# Altium footprint library PCB_Footprints.PcbLib: 303 footprints (part 18 of 19)
Each footprint in its own frame and in the unit in brackets; x right, y up, seen from the top. Pads: shape width x height; smd on the part's side, far side on the other; paste and mask are expansions set on the pad; w line width, h text height; cw(c..) or ccw(c..) is an arc to the next point about the centre after c.
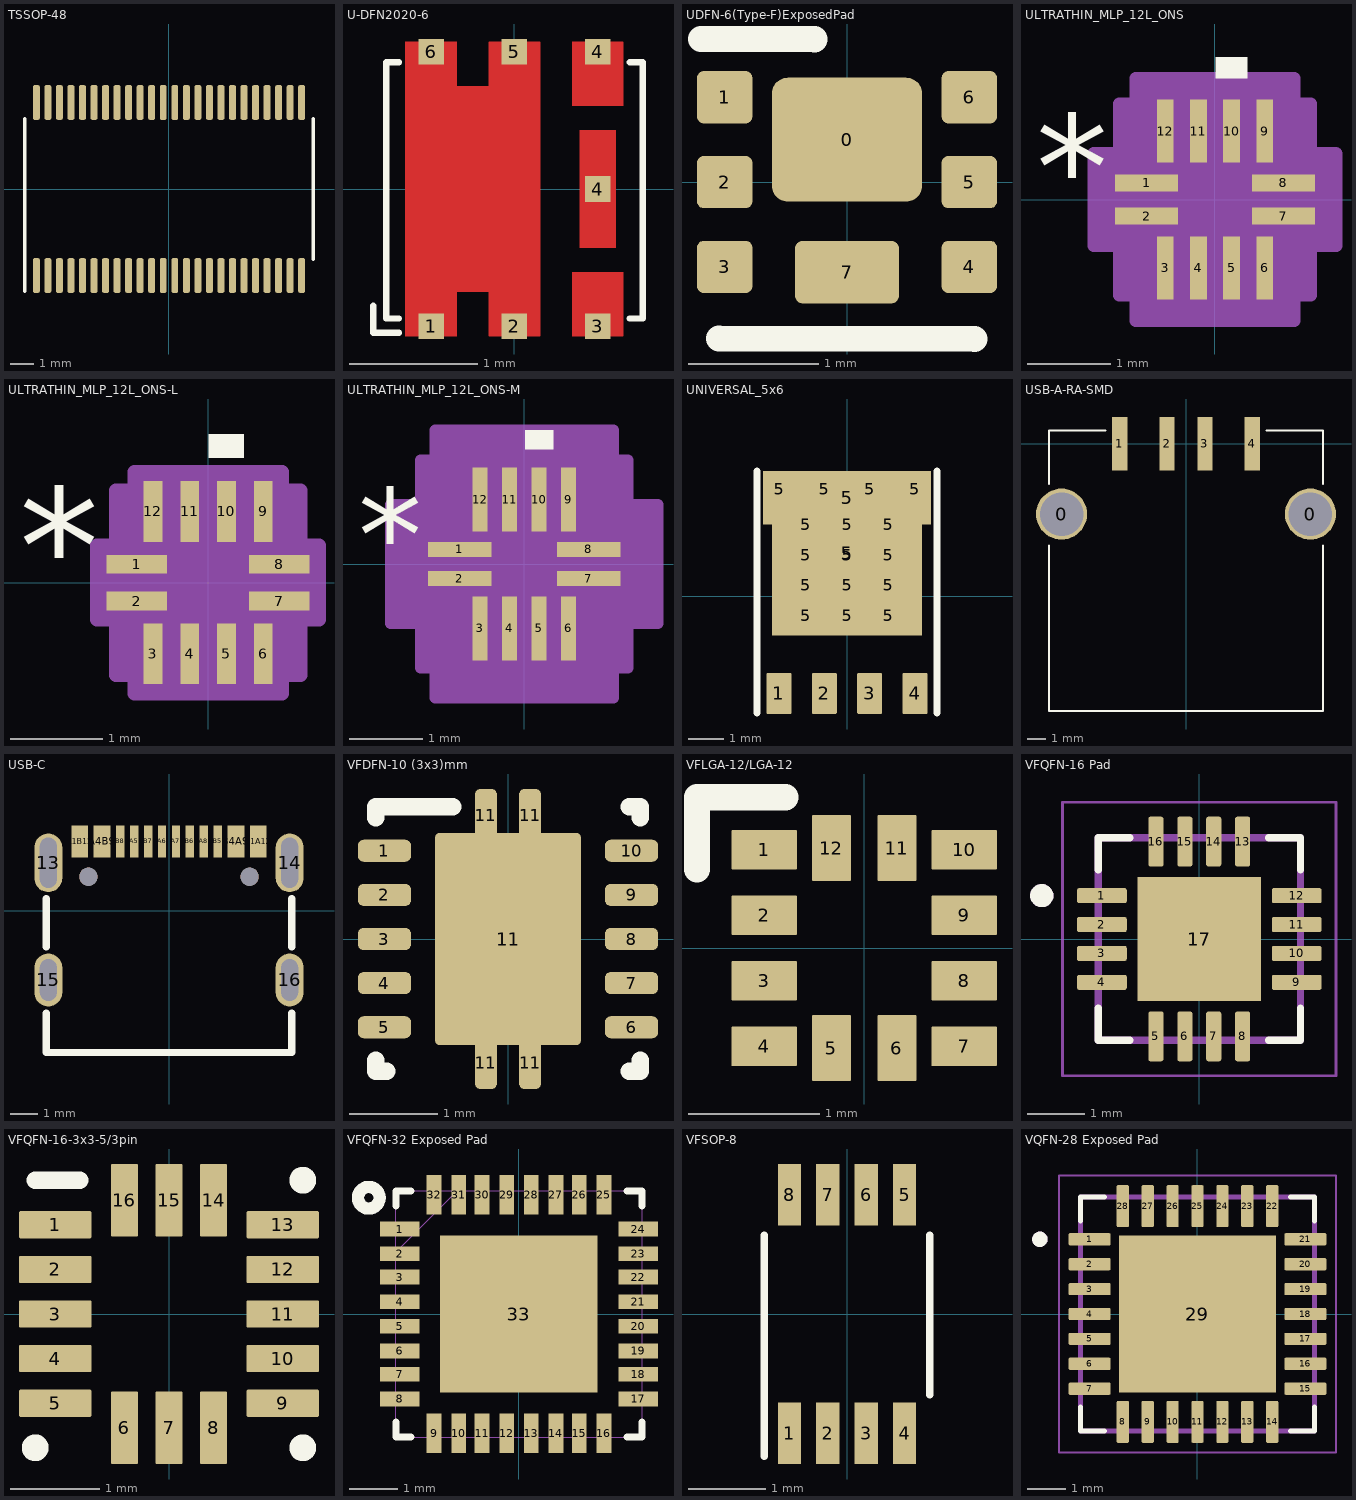
[diagram p17: the footprints below, top view; thin cyan lines are the x and y axes]

## TSSOP-48 [mm] "TSSOP-48, 0.5mm pitch. 6mm wide body. From TI DGG0056A example 4222167/A"
height 1.2
pads (48):
  rrect50% 0.3x1.5 smd: 1(-5.75,-3.75) 2(-5.25,-3.75) 3(-4.75,-3.75) 4(-4.25,-3.75) 5(-3.75,-3.75) 6(-3.25,-3.75) 7(-2.75,-3.75) 8(-2.25,-3.75) 9(-1.75,-3.75) 10(-1.25,-3.75) 11(-0.75,-3.75) 12(-0.25,-3.75) 13(0.25,-3.75) 14(0.75,-3.75) 15(1.25,-3.75) 16(1.75,-3.75) 17(2.25,-3.75) 18(2.75,-3.75) 19(3.25,-3.75) 20(3.75,-3.75) 21(4.25,-3.75) 22(4.75,-3.75) 23(5.25,-3.75) 24(5.75,-3.75) 25(5.75,3.75) 26(5.25,3.75) 27(4.75,3.75) 28(4.25,3.75) 29(3.75,3.75) 30(3.25,3.75) 31(2.75,3.75) 32(2.25,3.75) 33(1.75,3.75) 34(1.25,3.75) 35(0.75,3.75) 36(0.25,3.75) 37(-0.25,3.75) 38(-0.75,3.75) 39(-1.25,3.75) 40(-1.75,3.75) 41(-2.25,3.75) 42(-2.75,3.75) 43(-3.25,3.75) 44(-3.75,3.75) 45(-4.25,3.75) 46(-4.75,3.75) 47(-5.25,3.75) 48(-5.75,3.75)
Top Overlay:
  lines w0.15: -6.25,-4.425 -6.25,3.05 ; 6.25,-3.05 6.25,3.05
3D body "User Library-TSSOP-48W.STEP": height 1.2, standoff 0, extent -6.25,-4.05 6.25,4.05

## U-DFN2020-6 [mm]
pads (7):
  rect 0.2x0.2 smd mask+0: 1(-0.65,-1.07) 2(0,-1.07) 3(0.65,-1.07) 4(0.65,0) 4(0.65,1.07) 5(0,1.07) 6(-0.65,1.07)
Top Layer:
  region: 0.45,-1.15 0.45,-0.65 0.85,-0.65 0.85,-1.15
  region: 0.51,-0.46 0.51,0.46 0.79,0.46 0.79,-0.46
  region: 0.45,0.65 0.45,1.15 0.85,1.15 0.85,0.65
  region: -0.85,-1.15 -0.85,1.15 -0.45,1.15 -0.45,0.8 -0.2,0.8 -0.2,1.15 0.2,1.15 0.2,-1.15 -0.2,-1.15 -0.2,-0.8 -0.45,-0.8 -0.45,-1.15
Top Overlay:
  lines w0.05: -1.1,-0.91 -1.1,-1.12 -0.9,-1.12 ; -0.9,-1.01 -1,-1.01 -1,0.99 -0.9,0.99 ; 0.9,-1.01 1,-1.01 1,0.99 0.9,0.99
Top Paste:
  region: 0.45,-1.15 0.45,-0.65 0.85,-0.65 0.85,-1.15
  region: 0.51,-0.46 0.51,0.46 0.79,0.46 0.79,-0.46
  region: 0.45,0.65 0.45,1.15 0.85,1.15 0.85,0.65
  region: -0.85,-1.15 -0.85,1.15 -0.45,1.15 -0.45,0.8 -0.2,0.8 -0.2,1.15 0.2,1.15 0.2,-1.15 -0.2,-1.15 -0.2,-0.8 -0.45,-0.8 -0.45,-1.15
Top Solder:
  region: 0.45,-1.15 0.45,-0.65 0.85,-0.65 0.85,-1.15
  region: 0.51,-0.46 0.51,0.46 0.79,0.46 0.79,-0.46
  region: 0.45,0.65 0.45,1.15 0.85,1.15 0.85,0.65
  region: -0.85,-1.15 -0.85,1.15 -0.45,1.15 -0.45,0.8 -0.2,0.8 -0.2,1.15 0.2,1.15 0.2,-1.15 -0.2,-1.15 -0.2,-0.8 -0.45,-0.8 -0.45,-1.15
3D body: height 0.6, standoff 0, extent -1,-1.01 1,0.99

## UDFN-6(Type-F)ExposedPad [mm] "From DS38492 Rev. 3 - 2 Datasheet 03/20"
height 0.63
pads (8):
  rrect25% 1.15x0.95 smd: 0(0,0.325)
  rrect25% 0.425x0.4 smd: 1(-0.937,0.65) 2(-0.937,0) 3(-0.937,-0.65) 4(0.937,-0.65) 5(0.937,0) 6(0.937,0.65)
  rrect25% 0.8x0.48 smd: 7(0,-0.69)
Top Overlay:
  lines w0.2: -1.118,1.095 -0.249,1.095 ; -0.98,-1.198 0.978,-1.201
3D body "User Library-SOT1118 DFN2020-6.STEP": height 0.65, standoff 0, extent -1.04,-1.004 1.04,1.004

## ULTRATHIN_MLP_12L_ONS [mil]
pads (12):
  rect 30x8 smd paste+0 mask+0: 1(-32.5,7.87) 2(-32.5,-7.87) 7(32.5,-7.87) 8(32.5,7.87)
  rect 8x30 smd paste+0 mask+0: 3(-23.62,-32.5) 4(-7.87,-32.5) 5(7.87,-32.5) 6(23.62,-32.5) 9(23.62,32.5) 10(7.87,32.5) 11(-7.87,32.5) 12(-23.62,32.5)
Top Overlay:
  region: 15.37,57.5 0.37,57.5 0.37,67.5 15.37,67.5
  text "*" at -85,-9.25 h50
Mechanical 13:
  lines w1: -35.5,-14.5 14.5,35.5 ; -35.5,-35.5 -35.5,35.5 35.5,35.5 35.5,-35.5 -35.5,-35.5 ; -35.5,-12.87 -35.5,-2.87 -35.5,-12.87 ; -35.5,2.87 -35.5,12.87 -35.5,2.87 ; -28.62,-35.5 -18.62,-35.5 -28.62,-35.5 ; -28.62,35.5 -18.62,35.5 -28.62,35.5 ; -12.87,-35.5 -2.87,-35.5 -12.87,-35.5 ; -12.87,35.5 -2.87,35.5 -12.87,35.5 ; 2.87,-35.5 12.87,-35.5 2.87,-35.5 ; 2.87,35.5 12.87,35.5 2.87,35.5 ; 18.62,-35.5 28.62,-35.5 18.62,-35.5 ; 18.62,35.5 28.62,35.5 18.62,35.5 ; 35.5,-12.87 35.5,-2.87 35.5,-12.87 ; 35.5,2.87 35.5,12.87 35.5,2.87
  text "*" at -30,-9.25 h50
Mechanical 15:
  region: -37.62,-45.5 -45.5,-45.5 -45.5,-21.87 -57.5,-21.87 -57.5,21.87 -45.5,21.87 -45.5,45.5 -37.62,45.5 -37.62,57.5 37.62,57.5 37.62,45.5 45.5,45.5 45.5,21.87 57.5,21.87 57.5,-21.87 45.5,-21.87 45.5,-45.5 37.62,-45.5 37.62,-57.5 -37.62,-57.5
  lines w6: -57.5,-21.87 -57.5,21.87 -45.5,21.87 -45.5,45.5 -37.62,45.5 -37.62,57.5 37.62,57.5 37.62,45.5 45.5,45.5 45.5,21.87 57.5,21.87 57.5,-21.87 45.5,-21.87 45.5,-45.5 37.62,-45.5 37.62,-57.5 -37.62,-57.5 -37.62,-45.5 -45.5,-45.5 -45.5,-21.87 -57.5,-21.87
3D body "ULTRATHIN_MLP_12L_ONS.step": height 22.09, standoff 0, extent -35.51,-35.51 35.51,35.51

## ULTRATHIN_MLP_12L_ONS-L [mil]
pads (12):
  rect 26x8 smd paste+0 mask+0: 1(-30.5,7.87) 2(-30.5,-7.87) 7(30.5,-7.87) 8(30.5,7.87)
  rect 8x26 smd paste+0 mask+0: 3(-23.62,-30.5) 4(-7.87,-30.5) 5(7.87,-30.5) 6(23.62,-30.5) 9(23.62,30.5) 10(7.87,30.5) 11(-7.87,30.5) 12(-23.62,30.5)
Top Overlay:
  region: 15.37,53.5 0.37,53.5 0.37,63.5 15.37,63.5
  text "*" at -81,-9.25 h50
Mechanical 13:
  lines w1: -35.5,-14.5 14.5,35.5 ; -35.5,-35.5 35.5,-35.5 35.5,35.5 -35.5,35.5 -35.5,-35.5 ; -35.5,-12.87 -35.5,-2.87 -35.5,-12.87 ; -35.5,2.87 -35.5,12.87 -35.5,2.87 ; -28.62,-35.5 -18.62,-35.5 -28.62,-35.5 ; -28.62,35.5 -18.62,35.5 -28.62,35.5 ; -12.87,-35.5 -2.87,-35.5 -12.87,-35.5 ; -12.87,35.5 -2.87,35.5 -12.87,35.5 ; 2.87,-35.5 12.87,-35.5 2.87,-35.5 ; 2.87,35.5 12.87,35.5 2.87,35.5 ; 18.62,-35.5 28.62,-35.5 18.62,-35.5 ; 18.62,35.5 28.62,35.5 18.62,35.5 ; 35.5,-12.87 35.5,-2.87 35.5,-12.87 ; 35.5,2.87 35.5,12.87 35.5,2.87
  text "*" at -30,-9.25 h50
Mechanical 15:
  region: -31.62,-39.5 -39.5,-39.5 -39.5,-15.87 -47.5,-15.87 -47.5,15.87 -39.5,15.87 -39.5,39.5 -31.62,39.5 -31.62,47.5 31.62,47.5 31.62,39.5 39.5,39.5 39.5,15.87 47.5,15.87 47.5,-15.87 39.5,-15.87 39.5,-39.5 31.62,-39.5 31.62,-47.5 -31.62,-47.5
  lines w6: -47.5,-15.87 -39.5,-15.87 -39.5,-39.5 -31.62,-39.5 -31.62,-47.5 31.62,-47.5 31.62,-39.5 39.5,-39.5 39.5,-15.87 47.5,-15.87 47.5,15.87 39.5,15.87 39.5,39.5 31.62,39.5 31.62,47.5 -31.62,47.5 -31.62,39.5 -39.5,39.5 -39.5,15.87 -47.5,15.87 -47.5,-15.87
3D body "ULTRATHIN_MLP_12L_ONS.step": height 22.09, standoff 0, extent -35.51,-35.51 35.51,35.51

## ULTRATHIN_MLP_12L_ONS-M [mil]
pads (12):
  rect 34x8 smd paste+0 mask+0: 1(-34.5,7.87) 2(-34.5,-7.87) 7(34.5,-7.87) 8(34.5,7.87)
  rect 8x34 smd paste+0 mask+0: 3(-23.62,-34.5) 4(-7.87,-34.5) 5(7.87,-34.5) 6(23.62,-34.5) 9(23.62,34.5) 10(7.87,34.5) 11(-7.87,34.5) 12(-23.62,34.5)
Top Overlay:
  region: 15.37,61.5 0.37,61.5 0.37,71.5 15.37,71.5
  text "*" at -89,-9.25 h50
Mechanical 13:
  lines w1: -35.5,-14.5 14.5,35.5 ; -35.5,-35.5 35.5,-35.5 35.5,35.5 -35.5,35.5 -35.5,-35.5 ; -35.5,-12.87 -35.5,-2.87 -35.5,-12.87 ; -35.5,2.87 -35.5,12.87 -35.5,2.87 ; -28.62,-35.5 -18.62,-35.5 -28.62,-35.5 ; -28.62,35.5 -18.62,35.5 -28.62,35.5 ; -12.87,-35.5 -2.87,-35.5 -12.87,-35.5 ; -12.87,35.5 -2.87,35.5 -12.87,35.5 ; 2.87,-35.5 12.87,-35.5 2.87,-35.5 ; 2.87,35.5 12.87,35.5 2.87,35.5 ; 18.62,-35.5 28.62,-35.5 18.62,-35.5 ; 18.62,35.5 28.62,35.5 18.62,35.5 ; 35.5,-12.87 35.5,-2.87 35.5,-12.87 ; 35.5,2.87 35.5,12.87 35.5,2.87
  text "*" at -30,-9.25 h50
Mechanical 15:
  region: -47.62,-55.5 -55.5,-55.5 -55.5,-31.87 -71.5,-31.87 -71.5,31.87 -55.5,31.87 -55.5,55.5 -47.62,55.5 -47.62,71.5 47.62,71.5 47.62,55.5 55.5,55.5 55.5,31.87 71.5,31.87 71.5,-31.87 55.5,-31.87 55.5,-55.5 47.62,-55.5 47.62,-71.5 -47.62,-71.5
  lines w6: -71.5,-31.87 -55.5,-31.87 -55.5,-55.5 -47.62,-55.5 -47.62,-71.5 47.62,-71.5 47.62,-55.5 55.5,-55.5 55.5,-31.87 71.5,-31.87 71.5,31.87 55.5,31.87 55.5,55.5 47.62,55.5 47.62,71.5 -47.62,71.5 -47.62,55.5 -55.5,55.5 -55.5,31.87 -71.5,31.87 -71.5,-31.87
3D body "ULTRATHIN_MLP_12L_ONS.step": height 22.09, standoff 0, extent -35.51,-35.51 35.51,35.51

## UNIVERSAL_5x6 [mm] "Universal footprint for 5 x 6mm chip, from AND9137/D (On Semi)"
pads (22):
  rrect10% 0.7x1.15 smd paste-0.05 mask+0.075: 1(-1.905,-2.725) 2(-0.635,-2.725) 3(0.635,-2.725) 4(1.905,-2.725)
  rrect2% 0.6x0.9 on Top Paste paste-0.05 mask+0.075: 5(-1.9,3) 5(-0.633,3) 5(0.633,3) 5(1.9,3)
  rrect2% 0.9x0.6 on Top Paste paste-0.05 mask+0.075: 5(-1.15,-0.55) 5(-1.15,0.3) 5(-1.15,1.15) 5(-1.15,2) 5(0,-0.55) 5(0,0.3) 5(0,1.15) 5(0,2) 5(1.15,-0.55) 5(1.15,0.3) 5(1.15,1.15) 5(1.15,2)
  rect 4.2x4.6 smd paste-999 mask+0.075: 5(0,1.2)
  rect 4.7x1.5 smd paste-999 mask+0.075: 5(0,2.75)
Top Overlay:
  lines w0.2: -2.525,-3.267 -2.525,3.5 ; 2.525,-3.267 2.525,3.5
3D body "User Library-SOT669 (1).step": height 1.2, standoff 0, extent -2.5,-3.267 2.5,3.5

## USB-A-RA-SMD [mm] "Right-Angle USB A female, SMD. Based on CNC 1002-002-01100"
height 7
pads (6):
  round 2.7 hole 2.3: 0(-6.57,-3.71) 0(6.57,-3.71)
  rect 0.8x2.82 smd: 1(-3.5,0) 2(-1,0) 3(1,0) 4(3.5,0)
Top Overlay:
  lines w0.1: -7.225,-5.375 -7.225,-14.1 7.205,-14.1 ; -7.225,-2.125 -7.225,0.7 -4.25,0.7 ; 4.25,0.7 7.205,0.7 ; 7.225,-14.1 7.225,-5.375 ; 7.225,-2.125 7.225,0.7
3D body "USB-A-SMD-RA.step": height 7.74, standoff -2.63, extent -7.26,-14.135 7.24,0.748

## USB-C [mm]
pads (18):
  oval 1x2.1 hole 0.6 slot 1.8 at 90 deg: 13(-4.325,1.719) 14(4.325,1.719)
  oval 1x1.9 hole 0.6 slot 1.5 at 90 deg: 15(-4.325,-2.481) 16(4.325,-2.481)
  rect 0.6x1.15 smd: A1B12(-3.2,2.481) A4B9(-2.4,2.481) B1A12(3.2,2.481) B4A9(2.4,2.481)
  rect 0.3x1.15 smd: A5(-1.25,2.481) A6(-0.25,2.481) A7(0.25,2.481) A8(1.25,2.481) B5(1.75,2.481) B6(0.75,2.481) B7(-0.75,2.481) B8(-1.75,2.481)
  round 0.65 hole 0.65 unplated: ""(-2.89,1.219) ""(2.89,1.219)
Top Overlay:
  lines w0.254: -4.4,-3.659 -4.4,-5.081 4.4,-5.081 4.4,-3.659 ; -4.4,-1.304 -4.4,0.441 ; 4.4,-1.304 4.4,0.441
Top Paste:
  region: 3.825,-2.031 3.825,-1.932 3.901,-1.748 4.042,-1.607 4.226,-1.531 4.424,-1.531 4.608,-1.607 4.749,-1.748 4.825,-1.932 4.825,-2.031 4.825,-2.931 4.825,-3.031 4.749,-3.215 4.608,-3.355 4.424,-3.431 4.226,-3.431 4.042,-3.355 3.901,-3.215 3.825,-3.031 3.825,-2.931
  region: -4.825,-2.031 -4.825,-1.932 -4.749,-1.748 -4.608,-1.607 -4.424,-1.531 -4.226,-1.531 -4.042,-1.607 -3.901,-1.748 -3.825,-1.932 -3.825,-2.031 -3.825,-2.931 -3.825,-3.031 -3.901,-3.215 -4.042,-3.355 -4.226,-3.431 -4.424,-3.431 -4.608,-3.355 -4.749,-3.215 -4.825,-3.031 -4.825,-2.931
  region: 3.825,2.269 3.825,2.368 3.901,2.552 4.042,2.692 4.226,2.769 4.424,2.769 4.608,2.692 4.749,2.552 4.825,2.368 4.825,2.269 4.825,1.169 4.825,1.069 4.749,0.885 4.608,0.745 4.424,0.669 4.226,0.669 4.042,0.745 3.901,0.885 3.825,1.069 3.825,1.169
  region: -4.825,2.269 -4.825,2.368 -4.749,2.552 -4.608,2.692 -4.424,2.769 -4.226,2.769 -4.042,2.692 -3.901,2.552 -3.825,2.368 -3.825,2.269 -3.825,1.169 -3.825,1.069 -3.901,0.885 -4.042,0.745 -4.226,0.669 -4.424,0.669 -4.608,0.745 -4.749,0.885 -4.825,1.069 -4.825,1.169
  region: 2.9,3.056 3.5,3.056 3.5,1.906 2.9,1.906
  region: 2.1,3.056 2.7,3.056 2.7,1.906 2.1,1.906
  region: 1.6,3.056 1.9,3.056 1.9,1.906 1.6,1.906
  region: 1.1,3.056 1.4,3.056 1.4,1.906 1.1,1.906
  region: 0.6,3.056 0.9,3.056 0.9,1.906 0.6,1.906
  region: 0.1,3.056 0.4,3.056 0.4,1.906 0.1,1.906
  region: -0.4,3.056 -0.1,3.056 -0.1,1.906 -0.4,1.906
  region: -0.9,3.056 -0.6,3.056 -0.6,1.906 -0.9,1.906
  region: -1.4,3.056 -1.1,3.056 -1.1,1.906 -1.4,1.906
  region: -1.9,3.056 -1.6,3.056 -1.6,1.906 -1.9,1.906
  region: -2.7,3.056 -2.1,3.056 -2.1,1.906 -2.7,1.906
  region: -3.5,3.056 -2.9,3.056 -2.9,1.906 -3.5,1.906
Mechanical 15:
  circle w0.3: c2.89,1.219 r0.15
  circle w0.3: c-2.89,1.219 r0.15

## VFDFN-10 (3x3)mm [mm] "VFDFN-10 (3X3)MM or 10-VSON (3x3) from TPS3850-Q1 datasheet 2020/01"
pads (15):
  rrect50% 0.6x0.25 smd: 1(-1.4,1) 2(-1.4,0.5) 3(-1.4,0) 4(-1.4,-0.5) 5(-1.4,-1) 6(1.4,-1) 7(1.4,-0.5) 8(1.4,0) 9(1.4,0.5) 10(1.4,1)
  rrect50% 0.25x0.6 smd: 11(-0.25,-1.4) 11(-0.25,1.4) 11(0.25,-1.4) 11(0.25,1.4)
  rrect5% 1.65x2.4 smd: 11(0,0)
Top Overlay:
  lines w0.2: -1.5,-1.375 -1.5,-1.5 -1.375,-1.5 ; -1.5,1.375 -1.5,1.5 -0.625,1.5 ; 1.375,-1.5 1.5,-1.5 1.5,-1.375 ; 1.375,1.5 1.5,1.5 1.5,1.375
3D body "DRC0010R.stp": height 0.87, standoff 0, extent -1.5,-1.5 1.5,1.5

## VFLGA-12/LGA-12 [mm] "12-VFLGA / 12-LGA (2X2mm) from AIS2DW12 eval board gerbers"
pads (12):
  rrect5% 0.5x0.3 smd: 1(-0.763,0.75) 2(-0.763,0.25) 3(-0.763,-0.25) 4(-0.763,-0.75) 7(0.763,-0.75) 8(0.763,-0.25) 9(0.763,0.25) 10(0.763,0.75)
  rrect5% 0.3x0.5 smd: 5(-0.25,-0.763) 6(0.25,-0.763) 11(0.25,0.763) 12(-0.25,0.763)
Top Overlay:
  lines w0.2: -1.275,0.6 -1.275,1.15 -0.6,1.15
3D body: height 1, standoff 0, extent -1,-1 1,1

## VFQFN-16 Pad [mm]
pads (17):
  rrect25% 0.86x0.26 smd: 1(-1.685,0.75) 2(-1.685,0.25) 3(-1.685,-0.25) 4(-1.685,-0.75) 9(1.685,-0.75) 10(1.685,-0.25) 11(1.685,0.25) 12(1.685,0.75)
  rrect25% 0.26x0.86 smd: 5(-0.75,-1.685) 6(-0.25,-1.685) 7(0.25,-1.685) 8(0.75,-1.685) 13(0.75,1.685) 14(0.25,1.685) 15(-0.25,1.685) 16(-0.75,1.685)
  rect 2.14x2.14 smd paste-2: 17(0,0)
Top Overlay:
  circle w0.2: c-2.725,0.75 r0.1
  lines w0.127: -1.75,-1.2 -1.75,-1.75 -1.2,-1.75 ; -1.75,1.2 -1.75,1.75 -1.2,1.75 ; 1.2,-1.75 1.75,-1.75 1.75,-1.2 ; 1.2,1.75 1.75,1.75 1.75,1.2
Top Paste:
  region: 0.68,-0.68 -0.68,-0.68 -0.68,0.68 0.68,0.68
Mechanical 13:
  circle w0.2: c-2.725,0.75 r0.1
  lines w0.127: -1.75,-1.75 1.75,-1.75 1.75,1.75 -1.75,1.75 -1.75,-1.75
Mechanical 15:
  lines w0.05: -2.365,-2.365 2.365,-2.365 2.365,2.365 -2.365,2.365 -2.365,-2.365
3D body: height 1, standoff 0, extent -1.762,-1.75 1.75,1.75

## VFQFN-16-3x3-5/3pin [mm] "QFN-16, 3x3mm, with 5 and 3 pins per axys, no thermal pad. from MMA8451Q datasheet"
height 1
pads (16):
  rrect10% 0.813x0.305 smd: 1(-1.275,1) 2(-1.275,0.5) 3(-1.275,0) 4(-1.275,-0.5) 5(-1.275,-1) 9(1.275,-1) 10(1.275,-0.5) 11(1.275,0) 12(1.275,0.5) 13(1.275,1)
  rrect10% 0.305x0.813 smd: 6(-0.5,-1.275) 7(0,-1.275) 8(0.5,-1.275) 14(0.5,1.275) 15(0,1.275) 16(-0.5,1.275)
Top Overlay:
  circle w0.2: c1.5,1.5 r0.05
  circle w0.2: c1.5,-1.5 r0.05
  circle w0.2: c-1.5,-1.5 r0.05
  lines w0.2: -1.5,1.5 -1,1.5
3D body: height 1, standoff 0, extent -1.5,-1.5 1.5,1.5

## VFQFN-32 Exposed Pad [mil]
pads (33):
  rect 32x12 smd: 1(-97,69) 2(-97,49) 3(-97,30) 4(-97,10) 5(-97,-10) 6(-97,-30) 7(-97,-49) 8(-97,-69) 17(97,-69) 18(97,-49) 19(97,-30) 20(97,-10) 21(97,10) 22(97,30) 23(97,49) 24(97,69)
  rect 12x32 smd: 9(-69,-97) 10(-49,-97) 11(-30,-97) 12(-10,-97) 13(10,-97) 14(30,-97) 15(49,-97) 16(69,-97) 25(69,97) 26(49,97) 27(30,97) 28(10,97) 29(-10,97) 30(-30,97) 31(-49,97) 32(-69,97)
  rect 128x128 smd: 33(0,0)
Top Overlay:
  circle w10: c-122.05,94.49 r8.8
  lines w6: -100,-88 -100,-100 -88,-100 ; -100,88 -100,100 -88,100 ; 88,-100 100,-100 100,-88 ; 88,100 100,100 100,88
Mechanical 13:
  lines w0: -100,-75 -100,-63 ; -100,-55 -100,-43 ; -100,-35 -100,-24 ; -100,-16 -100,-4 ; -100,4 -100,16 ; -100,24 -100,35 ; -100,43 -100,55 ; -100,50 -50,100 ; -100,63 -100,75 ; -75,-100 -63,-100 ; -75,100 -63,100 ; -55,-100 -43,-100 ; -55,100 -43,100 ; -35,-100 -24,-100 ; -35,100 -24,100 ; -16,-100 -4,-100 ; -16,100 -4,100 ; 4,-100 16,-100 ; 4,100 16,100 ; 24,-100 35,-100 ; 24,100 35,100 ; 43,-100 55,-100 ; 43,100 55,100 ; 63,-100 75,-100 ; 63,100 75,100 ; 100,-75 100,-63 ; 100,-55 100,-43 ; 100,-35 100,-24 ; 100,-16 100,-4 ; 100,4 100,16 ; 100,24 100,35 ; 100,43 100,55 ; 100,63 100,75 ; -100,-100 100,-100 100,100 -100,100 -100,-100
3D body "step_temp.STEP": height 39.37, standoff 0, extent -98.43,-98.43 98.43,98.43

## VFSOP-8 [mm] "TSSOP-14, 0.65mm pitch. From TI DCU(S-PDSO-G8) 4210064/C 04/12 from sn74lvc2t45 datasheet"
pads (8):
  rect 0.3x0.8 smd: 1(-0.75,-1.55) 2(-0.25,-1.55) 3(0.25,-1.55) 4(0.75,-1.55) 5(0.75,1.55) 6(0.25,1.55) 7(-0.25,1.55) 8(-0.75,1.55)
Top Overlay:
  lines w0.1: -1.075,-1.85 -1.075,1.025 ; 1.075,-1.05 1.075,1.025
3D body "TSSOP50P310X90-8N.step": height 0.9, standoff 0, extent -1.05,-1.549 1.05,1.549

## VQFN-28 Exposed Pad [mm]
pads (29):
  rrect25% 1.1x0.32 smd: 1(-2.815,1.95) 2(-2.815,1.3) 3(-2.815,0.65) 4(-2.815,0) 5(-2.815,-0.65) 6(-2.815,-1.3) 7(-2.815,-1.95) 15(2.815,-1.95) 16(2.815,-1.3) 17(2.815,-0.65) 18(2.815,0) 19(2.815,0.65) 20(2.815,1.3) 21(2.815,1.95)
  rrect25% 0.32x1.1 smd: 8(-1.95,-2.815) 9(-1.3,-2.815) 10(-0.65,-2.815) 11(0,-2.815) 12(0.65,-2.815) 13(1.3,-2.815) 14(1.95,-2.815) 22(1.95,2.815) 23(1.3,2.815) 24(0.65,2.815) 25(0,2.815) 26(-0.65,2.815) 27(-1.3,2.815) 28(-1.95,2.815)
  rect 4.1x4.1 smd paste-3: 29(0,0)
Top Overlay:
  circle w0.2: c-4.115,1.95 r0.1
  lines w0.127: -3.05,-2.43 -3.05,-3.05 -2.43,-3.05 ; -3.05,2.43 -3.05,3.05 -2.43,3.05 ; 2.43,-3.05 3.05,-3.05 3.05,-2.43 ; 2.43,3.05 3.05,3.05 3.05,2.43
Top Paste:
  region: 1.675,-1.675 0.375,-1.675 0.375,-0.375 1.675,-0.375
  region: -0.375,-1.675 -1.675,-1.675 -1.675,-0.375 -0.375,-0.375
  region: 1.675,0.375 0.375,0.375 0.375,1.675 1.675,1.675
  region: -0.375,0.375 -1.675,0.375 -1.675,1.675 -0.375,1.675
Mechanical 13:
  circle w0.2: c-4.115,1.95 r0.1
  lines w0.127: -3.05,-3.05 -3.05,3.05 3.05,3.05 3.05,-3.05 -3.05,-3.05
Mechanical 15:
  lines w0.05: -3.615,-3.615 -3.615,3.615 3.615,3.615 3.615,-3.615 -3.615,-3.615
3D body "VQFN-28-ExposedPad.STEP": height 1, standoff 0, extent -3,-3 3,3